# Altium footprint library TomvanRijn-PCB.PcbLib: 165 footprints (part 4 of 11)
Each footprint in its own frame and in the unit in brackets; x right, y up, seen from the top. Pads: shape width x height; smd on the part's side, far side on the other; paste and mask are expansions set on the pad; w line width, h text height; cw(c..) or ccw(c..) is an arc to the next point about the centre after c.
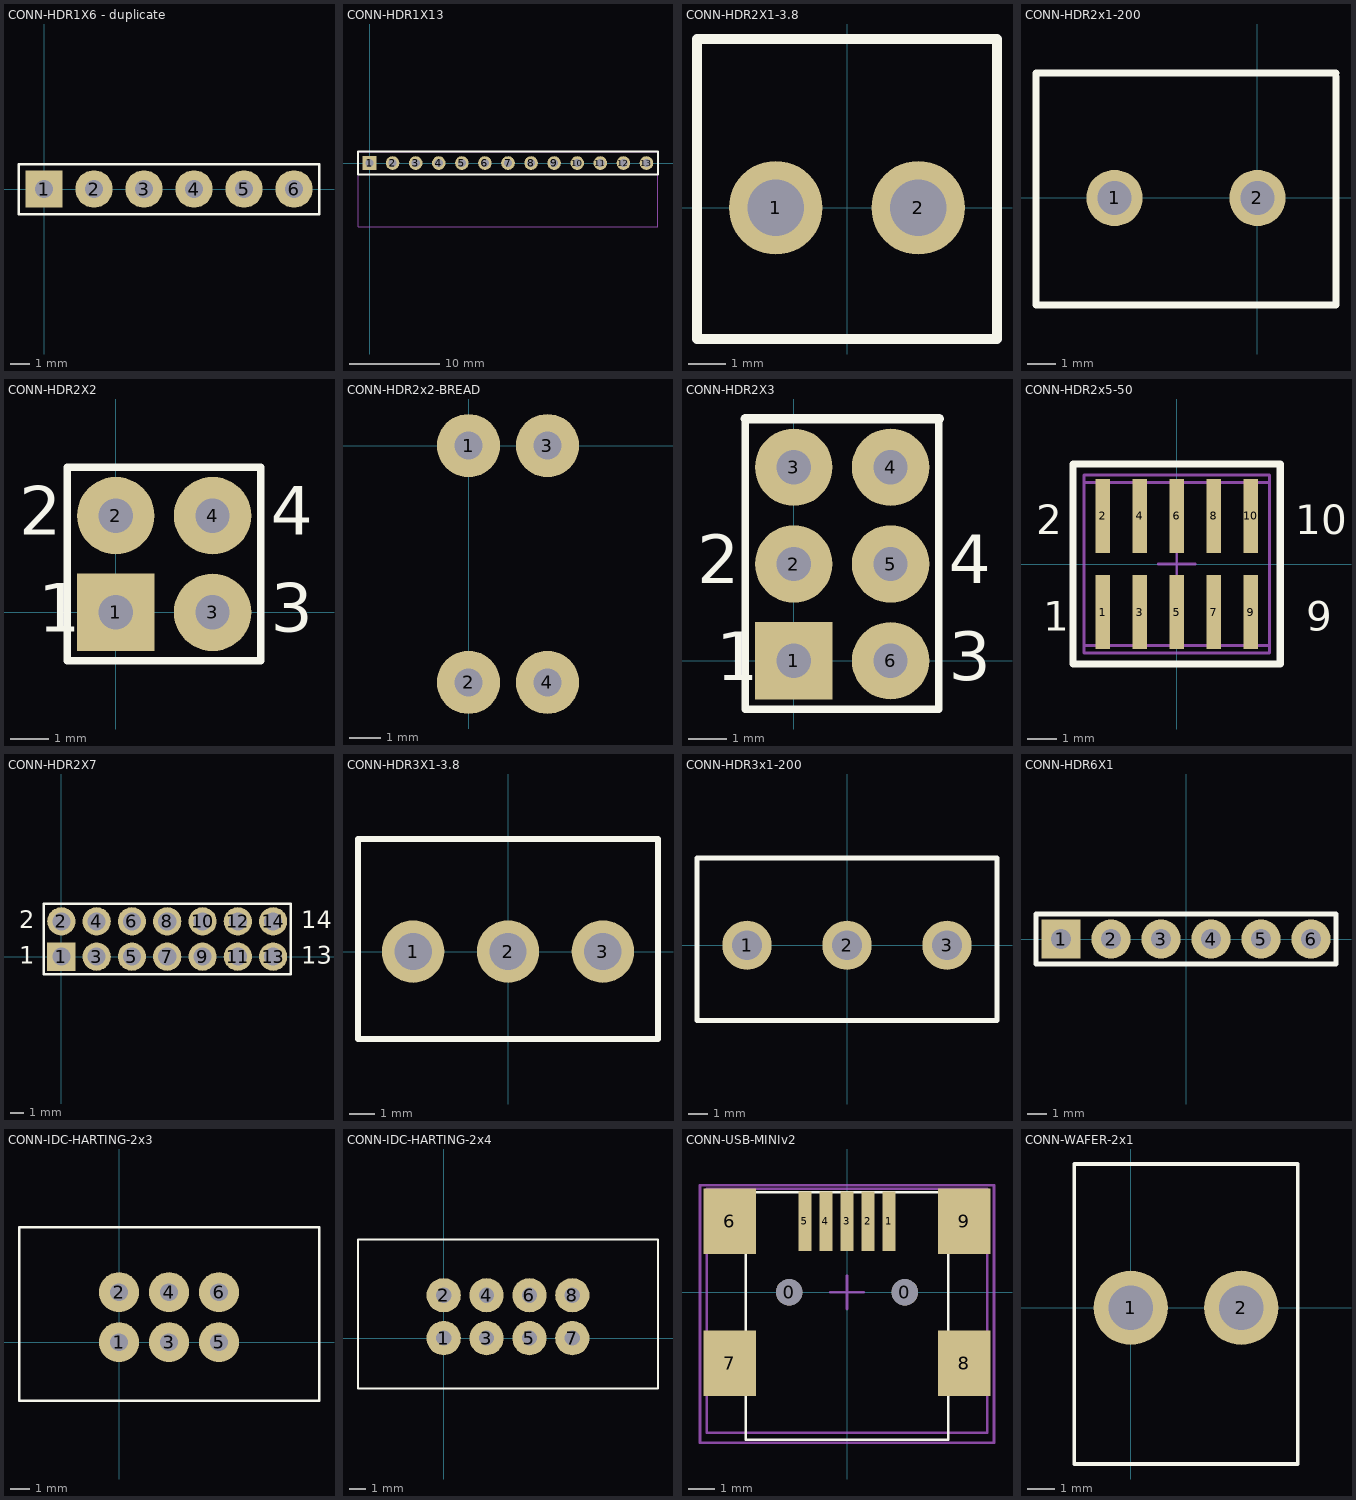
[diagram p3: the footprints below, top view; thin cyan lines are the x and y axes]

## CONN-HDR1X6 - duplicate [mm] "1X6 Male 2.54mm Header"
pads (6):
  rect 1.9x1.9 hole 0.9: 1(0,0)
  round 1.9 hole 0.9: 2(2.54,0) 3(5.08,0) 4(7.62,0) 5(10.16,0) 6(12.7,0)
Top Overlay:
  lines w0.127: -1.27,-1.27 -1.27,1.27 13.97,1.27 13.97,-1.27 -1.27,-1.27
3D body "User Library-1x6 TH Pitch 2_54mm.SLDPRT": height 9.5, standoff -3.2, extent -1.27,-1.27 13.97,1.27

## CONN-HDR1X13 [mm] "Connector; Header; 13 Positions, right angle"
height 0.178
pads (13):
  rect 1.5x1.5 hole 0.9: 1(0,0)
  round 1.5 hole 0.9: 2(2.54,0) 3(5.08,0) 4(7.62,0) 5(10.16,0) 6(12.7,0) 7(15.24,0) 8(17.78,0) 9(20.32,0) 10(22.86,0) 11(25.4,0) 12(27.94,0) 13(30.48,0)
Top Overlay:
  lines w0.2: -1.27,-1.27 31.75,-1.27 31.75,1.27 0.635,1.27 -1.27,1.27 -1.27,-1.27
Mechanical 13:
  lines w0.1: -1.27,-6.985 31.75,-6.985 31.75,1.27 -1.27,1.27 -1.27,-6.985
Mechanical 15:
  lines w0.1: -1.27,-6.985 31.75,-6.985 31.75,1.27 -1.27,1.27 -1.27,-6.985
  lines w0.203: 14.605,0 15.875,0 ; 15.24,-0.635 15.24,0.635
3D body "User Library-0_1inch pin strip right angle.step": height 4.33, standoff -3, extent -1.27,-7 31.75,1.27

## CONN-HDR2X1-3.8 [mm] "Header, 2 leads, 3.8 mm pitch"
height 10
pads (2):
  round 2.5 hole 1.5: 1(-1.9,0) 2(1.9,0)
Top Overlay:
  lines w0.254: -4,-3.5 4,-3.5 4,4.5 -4,4.5 -4,-3.5
3D body: height 10, standoff -3, extent -2.594,-0.698 -1.2,0.699
3D body: height 10, standoff -3, extent 1.206,-0.698 2.6,0.699
3D body: height 1.5, standoff 0, extent -3.999,-3.499 3.999,4.499

## CONN-HDR2x1-200 [mm] "Header, 2 way; 200 mil ptich"
height 12.7
pads (2):
  round 2 hole 1.2: 1(-5.08,0) 2(0,0)
Top Overlay:
  lines w0.254: 2.794,4.318 2.794,-3.81 -7.874,-3.81 -7.874,4.445 2.794,4.445
3D body "SCREW2.step": height 10, standoff -4, extent -7.54,-3.429 2.46,4.071

## CONN-HDR2X2 [mil] "Connector; Header; 2x2 Position"
pads (4):
  rect 80x80 hole 35.43: 1(0,0)
  round 80 hole 35.43: 2(0,100) 3(100,0) 4(100,100)
Top Overlay:
  lines w7.87: -50,-50 150,-50 150,150 -50,150 -50,-50
  text "3" at 160,-20 h50
  text "4" at 160,80 h50
  text "2" at -100,80 h50
  text "1" at -80,-20 h50
3D body "User Library-Header1x2.STEP": height 332.28, standoff -100, extent -49.99,-49.99 150.01,50.01
3D body "User Library-Header1x2.STEP": height 332.28, standoff -100, extent -49.99,50.01 150.01,150.01

## CONN-HDR2x2-BREAD [mil] "2x2 header 2.54mm pitch, 300mil spacing"
pads (4):
  round 80 hole 35.43: 1(0,0) 2(0,-300) 3(100,0) 4(100,-300)
3D body "User Library-Header1x2.STEP": height 341.79, standoff -90.49, extent -49.99,-49.99 150.01,50.01
3D body "User Library-Header1x2.STEP": height 341.79, standoff -90.49, extent -49.99,-349.99 150.01,-249.99

## CONN-HDR2X3 [mil] "Connector; Header; 2x2 Position"
pads (6):
  rect 80x80 hole 35.43: 1(0,0)
  round 80 hole 35.43: 2(0,100) 3(0,200) 4(100,200) 5(100,100) 6(100,0)
Top Overlay:
  lines w7.87: -50,250 -50,-50 150,-50 150,250
  lines w10: -50,250 150,250
  text "3" at 160,-20 h50
  text "4" at 160,80 h50
  text "2" at -100,80 h50
  text "1" at -80,-20 h50
3D body "User Library-Header1x2.STEP": height 332.28, standoff -100, extent -49.99,-49.99 150.01,50.01
3D body "User Library-Header1x2.STEP": height 332.28, standoff -100, extent -50,50 150,150
3D body "User Library-Header1x2.STEP": height 332.28, standoff -100, extent -49.99,150.01 150.01,250.01

## CONN-HDR2x5-50 [mil] "Header, SMD; 2 x 5; 50 mil pitch"
height 200
pads (10):
  rect 20x100 smd: 1(-100,-65) 2(-100,65) 3(-50,-65) 4(-50,65) 5(0,-65) 6(0,65) 7(50,-65) 8(50,65) 9(100,-65) 10(100,65)
Top Overlay:
  lines w10: -140,-135 -140,135 140,135 140,-135 -140,-135
  text "9" at 175,-90 h40
  text "10" at 160,40 h40
  text "2" at -190,40 h40
  text "1" at -180,-90 h40
Mechanical 13:
  lines w3.94: -125,-110 125,-110 125,110 -125,110 -125,-110
Mechanical 15:
  lines w3.94: -25,0 25,0 ; 0,-25 0,25 ; -125,-120 125,-120 125,120 -125,120 -125,-120
3D body "HDR5x2.step": height 177.17, standoff 0, extent -125,-108.27 125,108.27

## CONN-HDR2X7 [mil] "Connector; Header; 7x2 Position"
height 75.2
pads (14):
  rect 80x80 hole 51.18: 1(0,0)
  round 80 hole 51.18: 2(0,100) 3(100,0) 4(100,100) 5(200,0) 6(200,100) 7(300,0) 8(300,100) 9(400,0) 10(400,100) 11(500,0) 12(500,100) 13(600,0) 14(600,100)
Top Overlay:
  lines w7.87: -50,-50 650,-50 650,150 -50,150 -50,-50
  text "13" at 680,-20 h50
  text "14" at 680,80 h50
  text "1" at -120,-20 h50
  text "2" at -120,80 h50
3D body "HDR7X2.step": height 346.46, standoff -118.11, extent -197.63,-128.93 797.64,241.15

## CONN-HDR3X1-3.8 [mm] "Header, 3 leads, 3.8 mm pitch"
height 10
pads (3):
  round 2.5 hole 1.5: 1(-3.8,0) 2(0,0) 3(3.8,0)
Top Overlay:
  lines w0.254: -6,-3.5 6,-3.5 6,4.5 -6,4.5 -6,-3.5
3D body: height 1.5, standoff 0, extent -5.999,-3.499 5.999,4.499
3D body: height 10, standoff -3, extent 3.106,-0.698 4.5,0.699
3D body: height 10, standoff -3, extent -0.694,-0.698 0.7,0.699
3D body: height 10, standoff -3, extent -4.494,-0.698 -3.1,0.699

## CONN-HDR3x1-200 [mm] "Header, 3 way; 200 mil ptich"
height 12.7
pads (3):
  round 2.5 hole 1.5: 1(-5.08,0) 2(0,0) 3(5.08,0)
Top Overlay:
  lines w0.254: -7.62,-3.81 -7.62,4.445 7.62,4.445 7.62,-3.81 -7.62,-3.81
3D body "SCREW3.step": height 10, standoff -4, extent -7.525,-3.505 7.475,3.995

## CONN-HDR6X1 [mm] "Programming Connector, 6 x 1, 100 mil pitch"
pads (6):
  rect 2x2 hole 1: 1(-6.35,0)
  round 2 hole 1: 2(-3.81,0) 3(-1.27,0) 4(1.27,0) 5(3.81,0) 6(6.35,0)
Top Overlay:
  lines w0.254: -7.62,-1.27 7.62,-1.27 7.62,1.27 -7.62,1.27 -7.62,-1.27

## CONN-IDC-HARTING-2x3 [mil] "IDC HArting 2x3 Socket 2.54mm"
pads (6):
  round 80 hole 35.43: 1(0,0) 2(0,100) 3(100,0) 4(100,100) 5(200,0) 6(200,100)
Top Overlay:
  lines w5: -200,-117.5 400,-117.5 400,230 -200,230 -200,-117.5
3D body "User Library-IDC Socket Male 6pin Straight THT Goldplated 2_54mm.STEP": height 361.02, standoff -127.17, extent -199.6,-117.32 399.61,231.11

## CONN-IDC-HARTING-2x4 [mil] "IDC HArting 2x4 Socket 2.54mm"
pads (8):
  round 80 hole 35.43: 1(0,0) 2(0,100) 3(100,0) 4(100,100) 5(200,0) 6(200,100) 7(300,0) 8(300,100)
Top Overlay:
  lines w5: -200,-117.5 500,-117.5 500,230 -200,230 -200,-117.5
3D body "User Library-IDC Socket Male 8pin Straight THT Goldplated 2_54mm.step": height 371.02, standoff -117.17, extent -199.6,-117.31 499.62,231.11

## CONN-USB-MINIv2 [mm] "Connector, USB, B type, Mini"
height 2
pads (11):
  round 1 hole 1: 0(-2.2,0)
  round 1 hole 1 unplated: 0(2.2,0)
  rect 0.5x2.25 smd: 1(1.6,2.7) 2(0.8,2.7) 3(0,2.7) 4(-0.8,2.7) 5(-1.6,2.7)
  rect 2x2.5 smd: 6(-4.45,2.7) 7(-4.45,-2.7) 8(4.45,-2.7) 9(4.45,2.7)
Top Overlay:
  lines w0.1: -3.85,-5.6 -3.85,3.8 3.85,3.8 3.85,-5.6 -3.85,-5.6
Mechanical 13:
  lines w0.1: -5.334,-5.334 5.334,-5.334 5.334,3.937 -5.334,3.937 -5.334,-5.334
Mechanical 15:
  lines w0.1: -0.635,0 0.635,0 ; 0,-0.635 0,0.635 ; -5.588,-5.715 5.588,-5.715 5.588,4.064 -5.588,4.064 -5.588,-5.715
3D body "User Library-USB_mini_B.step": height 3.95, standoff -1, extent -5.35,-5.265 5.35,3.935

## CONN-WAFER-2x1 [mil] "Wafer Power Connector 2-pin 3.96mm pitch CH 3.96"
pads (2):
  round 105 hole 62.99: 1(0,0) 2(155.91,0)
Top Overlay:
  lines w5: -79.53,-220.47 235.43,-220.47 235.43,202.76 -79.53,202.76 -79.53,-220.47
3D body "39-26-3020.stp": height 574.8, standoff -175.2, extent -62.98,-220.47 218.91,202.76
3D body: height 118.11, standoff 0, extent -82.03,-222.97 237.93,205.26